# Altium footprint library IoWLabsModules.PcbLib: 54 footprints (part 1 of 4)
Each footprint in its own frame and in the unit in brackets; x right, y up, seen from the top. Pads: shape width x height; smd on the part's side, far side on the other; paste and mask are expansions set on the pad; w line width, h text height; cw(c..) or ccw(c..) is an arc to the next point about the centre after c.
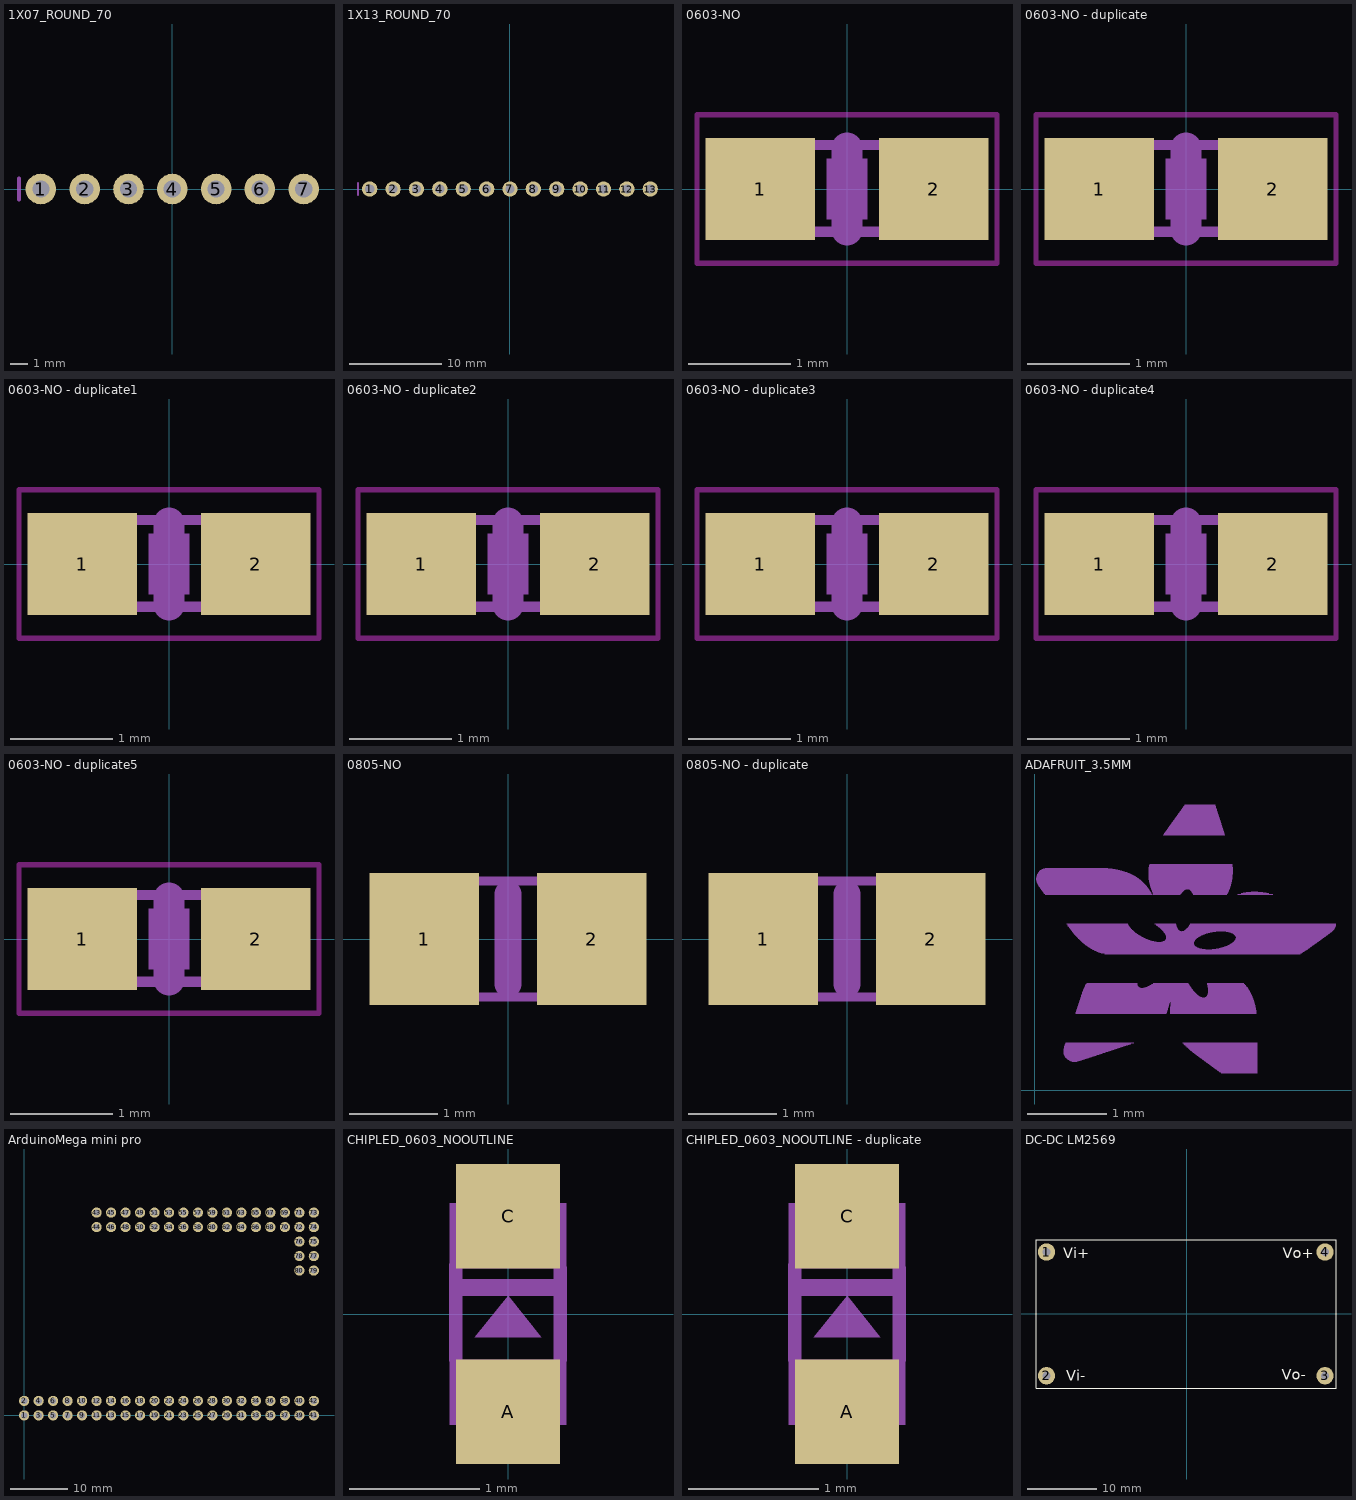
[diagram p0: the footprints below, top view; thin cyan lines are the x and y axes]

## 1X07_ROUND_70 [mil] "1X07_ROUND_70"
pads (7):
  round 70 hole 39.37: 1(-300,0) 2(-200,0) 3(-100,0) 4(0,0) 5(100,0) 6(200,0) 7(300,0)
Mechanical 18:
  rectangle: 190,-10 210,10
  rectangle: 90,-10 110,10
  rectangle: -10,-10 10,10
  rectangle: -110,-10 -90,10
  rectangle: -210,-10 -190,10
  rectangle: -310,-10 -290,10
  rectangle: 290,-10 310,10
  lines w8: -350,-25 -350,25

## 1X13_ROUND_70 [mil] "1X13_ROUND_70"
pads (13):
  round 66 hole 39.37: 1(-600,0) 2(-500,0) 3(-400,0) 4(-300,0) 5(-200,0) 6(-100,0) 7(0,0) 8(100,0) 9(200,0) 10(300,0) 11(400,0) 12(500,0) 13(600,0)
Mechanical 18:
  rectangle: 190,-10 210,10
  rectangle: 90,-10 110,10
  rectangle: -10,-10 10,10
  rectangle: -110,-10 -90,10
  rectangle: -210,-10 -190,10
  rectangle: -310,-10 -290,10
  rectangle: -410,-10 -390,10
  rectangle: -510,-10 -490,10
  rectangle: -610,-10 -590,10
  rectangle: 290,-10 310,10
  rectangle: 390,-10 410,10
  rectangle: 490,-10 510,10
  rectangle: 590,-10 610,10
  lines w8: -650,-25 -650,25

## 0603-NO [mm] "0603-NO"
pads (2):
  rect 1.075x1 smd: 1(-0.85,0) 2(0.85,0)
Keep-Out Layer:
  lines w0.051: -1.473,-0.729 1.473,-0.729 1.473,0.729 -1.473,0.729 -1.473,-0.729
Mechanical 2:
  lines w0.305: 0,-0.4 0,0.4
Mechanical 8:
  rectangle: -0.2,-0.3 0.2,0.3
Mechanical 18:
  rectangle: -0.838,-0.47 -0.338,0.48
  rectangle: 0.33,-0.47 0.83,0.48
  lines w0.102: -0.356,-0.419 0.356,-0.419 ; -0.356,0.432 0.356,0.432

## 0603-NO - duplicate [mm] "0603-NO"
pads (2):
  rect 1.075x1 smd: 1(-0.85,0) 2(0.85,0)
Keep-Out Layer:
  lines w0.051: -1.473,-0.729 -1.473,0.729 1.473,0.729 1.473,-0.729 -1.473,-0.729
Mechanical 2:
  lines w0.305: 0,-0.4 0,0.4
Mechanical 8:
  rectangle: -0.2,-0.3 0.2,0.3
Mechanical 18:
  rectangle: 0.33,-0.47 0.83,0.48
  rectangle: -0.838,-0.47 -0.338,0.48
  lines w0.102: -0.356,-0.419 0.356,-0.419 ; -0.356,0.432 0.356,0.432

## 0603-NO - duplicate1 [mm] "0603-NO"
pads (2):
  rect 1.075x1 smd: 1(-0.85,0) 2(0.85,0)
Keep-Out Layer:
  lines w0.051: -1.473,-0.729 -1.473,0.729 1.473,0.729 1.473,-0.729 -1.473,-0.729
Mechanical 2:
  lines w0.305: 0,-0.4 0,0.4
Mechanical 8:
  rectangle: -0.2,-0.3 0.2,0.3
Mechanical 18:
  rectangle: 0.33,-0.47 0.83,0.48
  rectangle: -0.838,-0.47 -0.338,0.48
  lines w0.102: -0.356,-0.419 0.356,-0.419 ; -0.356,0.432 0.356,0.432

## 0603-NO - duplicate2 [mm] "0603-NO"
pads (2):
  rect 1.075x1 smd: 1(-0.85,0) 2(0.85,0)
Keep-Out Layer:
  lines w0.051: -1.473,-0.729 -1.473,0.729 1.473,0.729 1.473,-0.729 -1.473,-0.729
Mechanical 2:
  lines w0.305: 0,-0.4 0,0.4
Mechanical 8:
  rectangle: -0.2,-0.3 0.2,0.3
Mechanical 18:
  rectangle: 0.33,-0.47 0.83,0.48
  rectangle: -0.838,-0.47 -0.338,0.48
  lines w0.102: -0.356,-0.419 0.356,-0.419 ; -0.356,0.432 0.356,0.432

## 0603-NO - duplicate3 [mm] "0603-NO"
pads (2):
  rect 1.075x1 smd: 1(-0.85,0) 2(0.85,0)
Keep-Out Layer:
  lines w0.051: -1.473,-0.729 -1.473,0.729 1.473,0.729 1.473,-0.729 -1.473,-0.729
Mechanical 2:
  lines w0.305: 0,-0.4 0,0.4
Mechanical 8:
  rectangle: -0.2,-0.3 0.2,0.3
Mechanical 18:
  rectangle: 0.33,-0.47 0.83,0.48
  rectangle: -0.838,-0.47 -0.338,0.48
  lines w0.102: -0.356,-0.419 0.356,-0.419 ; -0.356,0.432 0.356,0.432

## 0603-NO - duplicate4 [mm] "0603-NO"
pads (2):
  rect 1.075x1 smd: 1(-0.85,0) 2(0.85,0)
Keep-Out Layer:
  lines w0.051: -1.473,-0.729 -1.473,0.729 1.473,0.729 1.473,-0.729 -1.473,-0.729
Mechanical 2:
  lines w0.305: 0,-0.4 0,0.4
Mechanical 8:
  rectangle: -0.2,-0.3 0.2,0.3
Mechanical 18:
  rectangle: 0.33,-0.47 0.83,0.48
  rectangle: -0.838,-0.47 -0.338,0.48
  lines w0.102: -0.356,-0.419 0.356,-0.419 ; -0.356,0.432 0.356,0.432

## 0603-NO - duplicate5 [mm] "0603-NO"
pads (2):
  rect 1.075x1 smd: 1(-0.85,0) 2(0.85,0)
Keep-Out Layer:
  lines w0.051: -1.473,-0.729 -1.473,0.729 1.473,0.729 1.473,-0.729 -1.473,-0.729
Mechanical 2:
  lines w0.305: 0,-0.4 0,0.4
Mechanical 8:
  rectangle: -0.2,-0.3 0.2,0.3
Mechanical 18:
  rectangle: 0.33,-0.47 0.83,0.48
  rectangle: -0.838,-0.47 -0.338,0.48
  lines w0.102: -0.356,-0.419 0.356,-0.419 ; -0.356,0.432 0.356,0.432

## 0805-NO [mm] "0805-NO"
pads (2):
  rect 1.24x1.5 smd: 1(-0.95,0) 2(0.95,0)
Mechanical 2:
  lines w0.305: 0,-0.508 0,0.508
Mechanical 18:
  rectangle: 0.356,-0.724 1.106,0.726
  rectangle: -1.092,-0.724 -0.342,0.726
  lines w0.102: -0.381,0.66 0.381,0.66 ; -0.356,-0.66 0.381,-0.66

## 0805-NO - duplicate [mm] "0805-NO"
pads (2):
  rect 1.24x1.5 smd: 1(-0.95,0) 2(0.95,0)
Mechanical 2:
  lines w0.305: 0,-0.508 0,0.508
Mechanical 18:
  rectangle: 0.356,-0.724 1.106,0.726
  rectangle: -1.092,-0.724 -0.342,0.726
  lines w0.102: -0.381,0.66 0.381,0.66 ; -0.356,-0.66 0.381,-0.66

## ADAFRUIT_3.5MM [mm] "ADAFRUIT_3.5MM"
Mechanical 2:
  drawing of 1122 lines, arcs and shapes, not listed

## ArduinoMega mini pro [mm] "ArduinoMega mini pro"
pads (80):
  round 1.8 hole 1.1: 1(0,0) 2(0,2.54) 3(2.54,0) 4(2.54,2.54) 5(5.08,0) 6(5.08,2.54) 7(7.62,0) 8(7.62,2.54) 9(10.16,0) 10(10.16,2.54) 11(12.7,0) 12(12.7,2.54) 13(15.24,0) 14(15.24,2.54) 15(17.78,0) 16(17.78,2.54) 17(20.32,0) 18(20.32,2.54) 19(22.86,0) 20(22.86,2.54) 21(25.4,0) 22(25.4,2.54) 23(27.94,0) 24(27.94,2.54) 25(30.48,0) 26(30.48,2.54) 27(33.02,0) 28(33.02,2.54) 29(35.56,0) 30(35.56,2.54) 31(38.1,0) 32(38.1,2.54) 33(40.64,0) 34(40.64,2.54) 35(43.18,0) 36(43.18,2.54) 37(45.72,0) 38(45.72,2.54) 39(48.26,0) 40(48.26,2.54) 41(50.8,0) 42(50.8,2.54) 43(12.7,35.56) 44(12.7,33.02) 45(15.24,35.56) 46(15.24,33.02) 47(17.78,35.56) 48(17.78,33.02) 49(20.32,35.56) 50(20.32,33.02) 51(22.86,35.56) 52(22.86,33.02) 53(25.4,35.56) 54(25.4,33.02) 55(27.94,35.56) 56(27.94,33.02) 57(30.48,35.56) 58(30.48,33.02) 59(33.02,35.56) 60(33.02,33.02) 61(35.56,35.56) 62(35.56,33.02) 63(38.1,35.56) 64(38.1,33.02) 65(40.64,35.56) 66(40.64,33.02) 67(43.18,35.56) 68(43.18,33.02) 69(45.72,35.56) 70(45.72,33.02) 71(48.26,35.56) 72(48.26,33.02) 73(50.8,35.56) 74(50.8,33.02) 75(50.8,30.48) 76(48.26,30.48) 77(50.8,27.94) 78(48.26,27.94) 79(50.8,25.4) 80(48.26,25.4)
3D body "MEGA 2560 PRO (EMBED).stp": height 5.94, standoff -0.03, extent -1.909,-1.225 52.175,36.775

## CHIPLED_0603_NOOUTLINE [mil] "CHIPLED_0603_NOOUTLINE"
pads (2):
  rect 31.5x31.5 smd: A(0,-29.53) C(0,29.53)
Mechanical 2:
  rectangle: -15,5.5 15,10.5
  region: 0,5.5 -10,-7 10,-7
Mechanical 18:
  circle w2: c-13.78,24.61 r2.95
  rectangle: 6.89,-25.59 10.83,-21.65
  rectangle: -10.83,-25.59 -6.89,-21.65
  rectangle: -10.83,-22.64 10.83,-13.78
  rectangle: 9.84,-33.46 17.72,-13.78
  rectangle: -17.72,-33.46 -9.84,-13.78
  rectangle: -17.72,13.78 17.72,22.64
  rectangle: 9.84,21.65 17.72,33.46
  rectangle: -17.72,13.78 -15.75,28.54
  rectangle: -10.83,21.65 -8.86,23.62
  rectangle: -17.72,27.56 -9.84,33.46
  lines w2: -10.83,-32.48 cw(c0,-32.48) 10.83,-32.48
  lines w4: -15.75,-13.78 -15.75,14.76 ; -11.81,31.5 ccw(c0,32.53) 11.81,31.5 ; 15.75,-13.78 15.75,13.78

## CHIPLED_0603_NOOUTLINE - duplicate [mil] "CHIPLED_0603_NOOUTLINE"
pads (2):
  rect 31.5x31.5 smd: A(0,-29.53) C(0,29.53)
Mechanical 2:
  rectangle: -15,5.5 15,10.5
  region: 0,5.5 -10,-7 10,-7
Mechanical 18:
  circle w2: c-13.78,24.61 r2.95
  rectangle: 6.89,-25.59 10.83,-21.65
  rectangle: -10.83,-25.59 -6.89,-21.65
  rectangle: -10.83,-22.64 10.83,-13.78
  rectangle: 9.84,-33.46 17.72,-13.78
  rectangle: -17.72,-33.46 -9.84,-13.78
  rectangle: -17.72,13.78 17.72,22.64
  rectangle: 9.84,21.65 17.72,33.46
  rectangle: -17.72,13.78 -15.75,28.54
  rectangle: -10.83,21.65 -8.86,23.62
  rectangle: -17.72,27.56 -9.84,33.46
  lines w2: -10.83,-32.48 cw(c0,-32.48) 10.83,-32.48
  lines w4: -15.75,-13.78 -15.75,14.76 ; -11.81,31.5 ccw(c0,32.53) 11.81,31.5 ; 15.75,-13.78 15.75,13.78

## DC-DC LM2569 [mm]
pads (4):
  round 2.5 hole 1.2: 1(-20.2,8.925) 2(-20.2,-8.925) 3(20,-8.925) 4(20,8.925)
Top Overlay:
  lines w0.127: -21.725,-10.7 -21.725,10.675 21.575,10.675 21.575,-10.7 -21.725,-10.7
  text "Vo+" at 13.925,8.025 h1.52
  text "Vo-" at 13.775,-9.475 h1.52
  text "Vi-" at -17.35,-9.65 h1.52
  text "Vi+" at -17.825,8.025 h1.52
3D body "LM2596 DC to DC Buck Converter 3 A.STEP": height 13.35, standoff -1.8, extent -21.675,-10.625 21.525,10.625